# Altium footprint library DM6010_R0M0E0.PcbLib: 11 footprints
Each footprint in its own frame and in the unit in brackets; x right, y up, seen from the top. Pads: shape width x height; smd on the part's side, far side on the other; paste and mask are expansions set on the pad; w line width, h text height; cw(c..) or ccw(c..) is an arc to the next point about the centre after c.
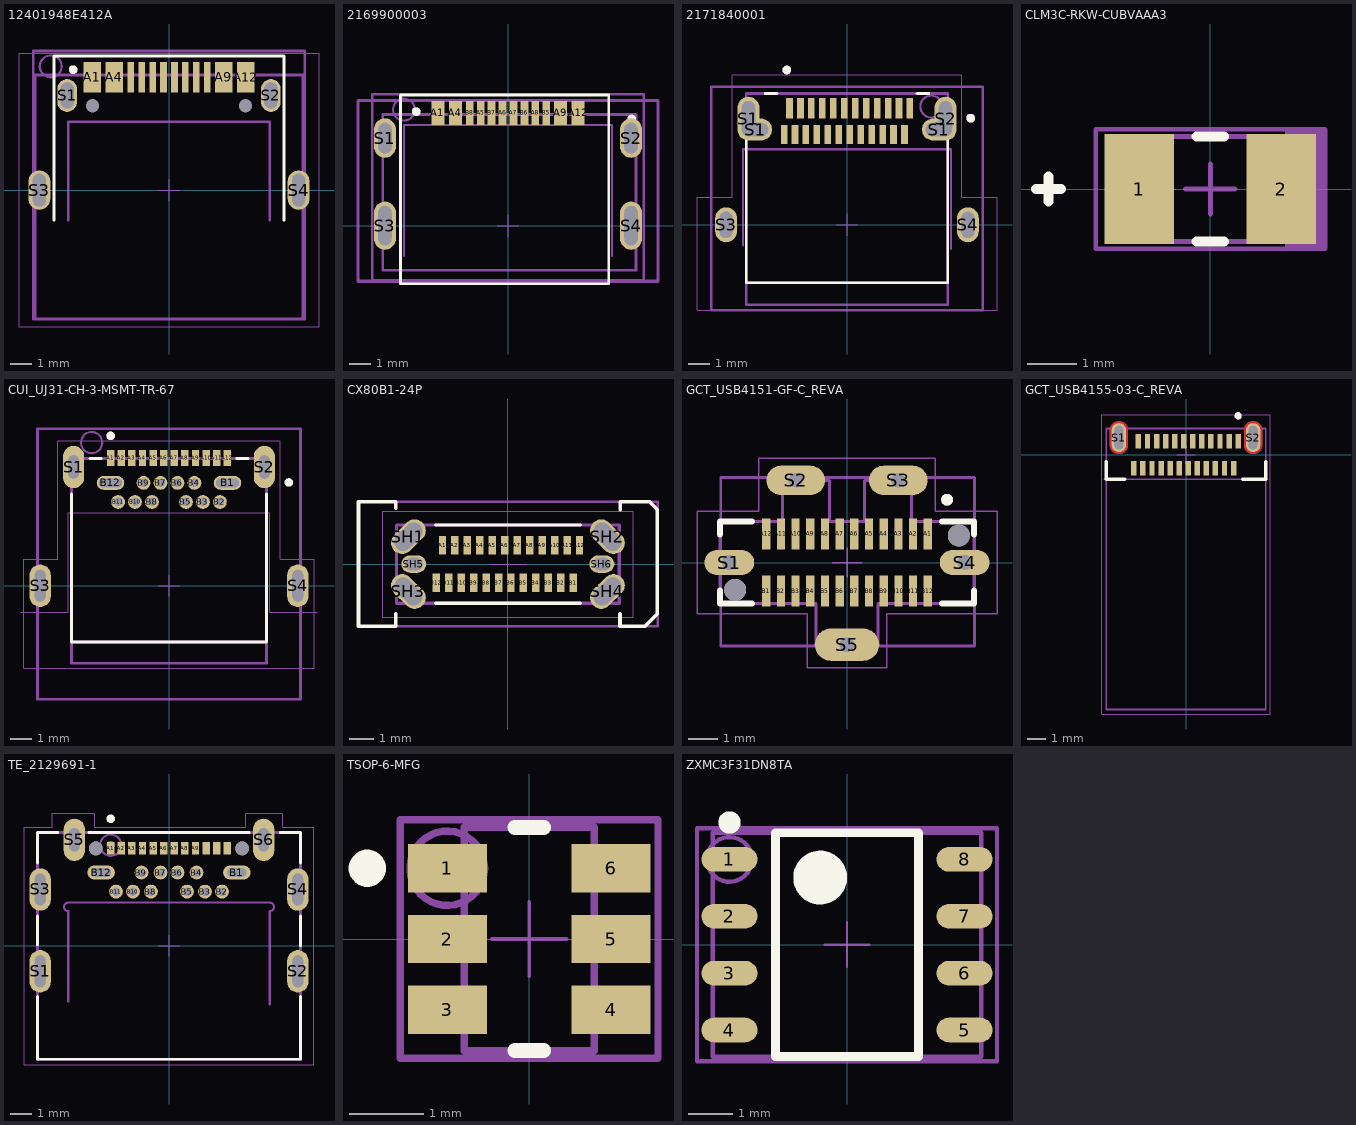
[diagram p0: the footprints below, top view; thin cyan lines are the x and y axes]

## 12401948E412A [mm]
pads (18):
  rect 0x0 hole 0.6 unplated paste-2 mask-2: A(-3.5,3.85) A(3.5,3.85)
  rect 0.8x1.4 smd: A1(-3.5,5.15) A4(-2.5,5.15) A9(2.5,5.15) A12(3.5,5.15)
  rect 0.3x1.4 smd: A5(-1.25,5.15) A6(-0.25,5.15) A7(0.25,5.15) A8(1.25,5.15) B5(1.75,5.15) B6(0.75,5.15) B7(-0.75,5.15) B8(-1.75,5.15)
  oval 0.9x1.5 hole 0.6 slot 1.2 at 90 deg: S1(-4.65,4.32) S2(4.65,4.32)
  oval 1x1.8 hole 0.6 slot 1.5 at 90 deg mask+0.102: S3(-5.92,0) S4(5.92,0)
Top Overlay:
  circle w0.2: c-4.375,5.5 r0.1
  lines w0.127: -5.25,-1.375 -5.25,6.125 5.25,6.125 5.25,-1.375
Mechanical 1:
  lines w0.1: -4.6,-1.375 -4.6,3.125 4.6,3.125 4.6,-1.375
Top Assembly:
  circle w0.1: c-5.4,5.65 r0.5
  lines w0.127: -6.2,-5.9 -6.2,6.35 6.2,6.35 6.2,-5.9 -6.2,-5.9
  text "'.Designator'" at 0,-0.125 h1
Top Courtyard:
  lines w0.05: -0.5,0 0.5,0 ; 0,-0.5 0,0.5 ; -6.85,-6.25 6.85,-6.25 6.85,1.25 6.85,6.25 -6.85,6.25 -6.85,1.25 -6.85,-6.25
Top Component Outline:
  lines w0.127: -6.125,-5.875 6.125,-5.875 6.125,5.25 -6.125,5.25 -6.125,-5.875
3D body "C12401948-1.stp": height 2.55, standoff -1.51, extent -6.065,-5.857 6.075,5.213

## 2169900003 [mm]
pads (16):
  rect 0.6x1.1 smd: A1(-3.2,5.15) A4(-2.4,5.15) A9(2.4,5.15) A12(3.2,5.15)
  rect 0.35x1.1 smd: A5(-1.25,5.15) A6(-0.25,5.15) A7(0.25,5.15) A8(1.25,5.15) B5(1.75,5.15) B6(0.75,5.15) B7(-0.75,5.15) B8(-1.75,5.15)
  oval 1x1.8 hole 0.6 slot 1.4 at 90 deg: S1(-5.62,4) S2(5.62,4)
  oval 1x2.2 hole 0.6 slot 1.8 at 90 deg mask+0.102: S3(-5.62,0) S4(5.62,0)
Top Overlay:
  circle w0.2: c-4.191,5.207 r0.1
  circle w0.2: c5.65,4.87 r0.1
  lines w0.127: -4.915,-2.65 -4.915,5.969 4.6,5.969 4.6,-2.65 -4.915,-2.65
Mechanical 1:
  lines w0.1: -4.75,-1.375 -4.75,4.6 4.75,4.6 4.75,-1.375
Top Assembly:
  circle w0.1: c-4.75,5.3 r0.5
  lines w0.127: -6.2,-2.5 -6.2,6 6.2,6 6.2,-2.5 -6.2,-2.5
  text "'.Designator'" at 0,-0.125 h1
Top 3D Body:
  circle w0.2: c-4.191,5.207 r0.1
Top Courtyard:
  lines w0.05: -0.5,0 0.5,0 ; 0,-0.5 0,0.5
  lines w0.15: -6.85,-2.54 -6.85,1.25 -6.85,5.715 6.85,5.715 6.85,1.25 6.85,-2.54 -6.85,-2.54
Top Component Outline:
  lines w0.127: -5.715,-2.032 -5.715,5.08 5.842,5.08 5.842,-2.032 -5.715,-2.032
3D body "2169900003.stp": height 2.16, standoff -1.02, extent -5.77,-2.076 5.77,5.124

## 2171840001 [mm]
pads (30):
  rect 0.3x0.95 smd: A1(-2.625,5.325) A2(-2.125,5.325) A3(-1.625,5.325) A4(-1.125,5.325) A5(-0.625,5.325) A6(-0.125,5.325) A7(0.375,5.325) A8(0.875,5.325) A9(1.375,5.325) A10(1.875,5.325) A11(2.375,5.325) A12(2.875,5.325)
  rect 0.3x0.85 smd: B1(2.625,4.125) B2(2.125,4.125) B3(1.625,4.125) B4(1.125,4.125) B5(0.625,4.125) B6(0.125,4.125) B7(-0.375,4.125) B8(-0.875,4.125) B9(-1.375,4.125) B10(-1.875,4.125) B11(-2.375,4.125) B12(-2.875,4.125)
  oval 1x2 hole 0.6 slot 1.6 at 90 deg: S1(-4.5,4.85) S2(4.5,4.85)
  oval 1.54x1 hole 0.6 slot 1.2 at 0 deg: S1(-4.191,4.35) S1(4.191,4.35)
  oval 1x1.6 hole 0.6 slot 1.2 at 90 deg: S3(-5.52,0) S4(5.52,0)
Top Overlay:
  circle w0.2: c-2.75,7.07 r0.1
  circle w0.2: c5.65,4.87 r0.1
  lines w0.127: -4.6,4.33 -4.6,-2.65 4.6,-2.65 4.6,4.33 ; -3.73,6 -3.2,6 ; 3.2,6 3.73,6
Mechanical 1:
  lines w0.1: -4.75,-0.95 -4.75,3.45 4.75,3.45 4.75,-1.1
Top Assembly:
  circle w0.1: c3.85,5.4 r0.5
  lines w0.127: -6.2,-3.9 6.2,-3.9 6.2,6.3 -6.2,6.3 -6.2,-3.9
  text "'.Designator'" at 0,-0.125 h1
Top 3D Body:
  circle w0.2: c-2.75,7.07 r0.1
  circle w0.2: c5.65,4.87 r0.1
  lines w0.127: -4.6,-2.65 -4.6,-3.65 4.6,-3.65 4.6,-2.65 ; -4.6,-2.65 -4.6,6 4.6,6 4.6,-2.65 ; -4.6,-2.65 4.6,-2.65
Top Courtyard:
  lines w0.05: -0.5,0 0.5,0 ; 0,-0.5 0,0.5 ; -6.85,-3.9 -6.85,1.25 -5.25,1.25 -5.25,6.85 5.25,6.85 5.25,1.25 6.85,1.25 6.85,-3.9 -6.85,-3.9
3D body "2171840001.stp": height 2.36, standoff -0.8, extent -5.67,-2.54 5.67,5.56

## CLM3C-RKW-CUBVAAA3 [mm]
pads (2):
  rect 1.4x2.2 smd paste+0 mask+0: 1(-1.425,0) 2(1.425,0)
Top Overlay:
  lines w0.2: -3.5,0 -3,0 ; -3.25,-0.25 -3.25,0.25 ; -0.275,-1.05 0.275,-1.05 ; -0.275,1.05 0.275,1.05
Top Assembly:
  rectangle: 1.5,-1.2 2.3,1.2
  lines w0.1: -2.3,-1.2 -2.3,1.2 2.3,1.2 2.3,-1.2 -2.3,-1.2
  text ".Designator" at 0,0 h1
Top Courtyard:
  lines w0.05: -2.3,-1.2 -2.3,1.2 2.3,1.2 2.3,-1.2 -2.3,-1.2
  lines w0.1: -0.5,0 0.5,0 ; 0,-0.5 0,0.5
Top Component Outline:
  lines w0.1: -1.4,-1.05 -1.4,1.05 1.4,1.05 1.4,-1.05 -1.4,-1.05
3D body "Diode_Cree_CLM3C-AKW-CUBVA353_eec.STEP": height 0.25, standoff 0, extent -2.3,-1.2 2.3,1.2

## CUI_UJ31-CH-3-MSMT-TR-67 [mm]
pads (28):
  rect 0.35x0.75 smd: A1(-2.75,6.025) A2(-2.25,6.025) A3(-1.75,6.025) A4(-1.25,6.025) A5(-0.75,6.025) A6(-0.25,6.025) A7(0.25,6.025) A8(0.75,6.025) A9(1.25,6.025) A10(1.75,6.025) A11(2.25,6.025) A12(2.75,6.025)
  oval 1.3x0.65 hole 0.4 slot 1.08 at 0 deg: B1(2.76,4.85) B12(-2.76,4.85)
  round 0.65 hole 0.4: B2(2.4,3.95) B3(1.6,3.95) B4(1.2,4.85) B5(0.8,3.95) B6(0.4,4.85) B7(-0.4,4.85) B8(-0.8,3.95) B9(-1.2,4.85) B10(-1.6,3.95) B11(-2.4,3.95)
  oval 1x2 hole 0.5 slot 1.1 at 90 deg: S1(-4.5,5.6) S2(4.5,5.6)
  oval 1x2 hole 0.5 slot 1.5 at 90 deg: S3(-6.075,0) S4(6.075,0)
Top Overlay:
  circle w0.2: c-2.75,7.07 r0.1
  circle w0.2: c5.65,4.87 r0.1
  lines w0.127: -4.6,4.33 -4.6,-2.65 4.6,-2.65 4.6,4.33 ; -3.73,6 -3.2,6 ; 3.2,6 3.73,6
Mechanical 1:
  lines w0: -7,-1.25 -4.75,-1.25 -4.75,3.45 4.75,3.45 4.75,-1.25 7,-1.25
Top Assembly:
  circle w0.1: c-3.65,6.75 r0.5
  lines w0.127: -6.2,-5.35 -6.2,7.4 6.2,7.4 6.2,-5.35 -6.2,-5.35
  text "'.Designator'" at 0,-0.125 h1
Top 3D Body:
  circle w0.2: c-2.75,7.07 r0.1
  lines w0.127: -4.6,-2.65 -4.6,-3.65 4.6,-3.65 4.6,-2.65 ; -4.6,-2.65 -4.6,6 4.6,6 4.6,-2.65 ; -4.6,-2.65 4.6,-2.65
Top Courtyard:
  lines w0.05: -0.5,0 0.5,0 ; 0,-0.5 0,0.5 ; -6.85,-3.9 -6.85,1.25 -5.25,1.25 -5.25,6.85 5.25,6.85 5.25,1.25 6.85,1.25 6.85,-3.9 -6.85,-3.9
3D body "CUI_DEVICES_UJ31-CH-3-MSMT-TR-67.step": height 2.32, standoff -1.7, extent -6.175,-3.713 6.175,6.223

## CX80B1-24P [mm] "USB3.1 Type-C Molex SMT, Through Hole, Vertical"
height 5
pads (30):
  rect 0.3x0.75 smd: A1(-2.625,0.755) A2(-2.125,0.755) A3(-1.625,0.755) A4(-1.125,0.755) A5(-0.625,0.755) A6(-0.125,0.755) A7(0.375,0.755) A8(0.875,0.755) A9(1.375,0.755) A10(1.875,0.755) A11(2.375,0.755) A12(2.875,0.755) B1(2.625,-0.755) B2(2.125,-0.755) B3(1.625,-0.755) B4(1.125,-0.755) B5(0.625,-0.755) B6(0.125,-0.755) B7(-0.375,-0.755) B8(-0.875,-0.755) B9(-1.375,-0.755) B10(-1.875,-0.755) B11(-2.375,-0.755) B12(-2.875,-0.755)
  oval 1.6x0.9 hole 0.7 slot 1.3 at 45 deg rot 45: SH1(-3.995,1.1) SH4(3.995,-1.1)
  oval 1.6x0.9 hole 0.7 slot 1.3 at 135 deg rot 135: SH2(3.995,1.1) SH3(-3.995,-1.1)
  oval 1x0.7 hole 0.5 slot 0.7 at 0 deg: SH5(-3.775,0) SH6(3.775,0)
Top Overlay:
  lines w0.127: -2.905,-1.57 2.905,-1.57 ; -2.905,1.57 2.905,1.57
  lines w0.15: -4.5,-1.993 -4.5,-2.5 -6,-2.5 -6,2.5 -4.5,2.5 -4.5,2.238 ; 4.502,-1.991 4.502,-2.5 5.506,-2.5 5.591,-2.415 6,-2.006 6,2.186 5.686,2.5 5.601,2.5 4.506,2.5 4.506,2.18
Top Solder:
  drawing of 2 lines, arcs and shapes, not listed
Bottom Solder:
  drawing of 2 lines, arcs and shapes, not listed
Top Assembly:
  lines w0.1: -5.999,-2.506 -5.999,2.501 6.024,2.501 6.024,-2.506 -5.999,-2.506
  text "'.Designator'" at -0.776,-0.315 h1
Top 3D Body:
  lines w0.127: -4.47,-1.57 -4.47,1.57 4.47,1.57 4.47,-1.57 -4.47,-1.57
Top Courtyard:
  lines w0.05: -0.75,0 0,0 ; 0,-0.75 0,0 ; 0,0.75 0,0 ; 0.75,0 0,0 ; -6.018,-2.488 6.012,-2.488 6.012,2.512 -6.018,2.512 -6.018,-2.488 ; -5.025,-2.125 -5.025,2.125 5.025,2.125 5.025,-2.125 -5.025,-2.125
Top Component Outline:
  lines w0.1: -6.01,-2.492 -6.01,2.504 6.027,2.504 6.027,-2.492 -6.01,-2.492
3D body "DXhfs.step": height 7.17, standoff -0.93, extent -4.745,-2.49 4.795,2.51

## GCT_USB4151-GF-C_REVA [mm]
pads (31):
  rect 0.28x1.05 smd: A1(2.75,0.975) A2(2.25,0.975) A3(1.75,0.975) A4(1.25,0.975) A5(0.75,0.975) A6(0.25,0.975) A7(-0.25,0.975) A8(-0.75,0.975) A9(-1.25,0.975) A10(-1.75,0.975) A11(-2.25,0.975) A12(-2.75,0.975) B1(-2.75,-0.975) B2(-2.25,-0.975) B3(-1.75,-0.975) B4(-1.25,-0.975) B5(-0.75,-0.975) B6(-0.25,-0.975) B7(0.25,-0.975) B8(0.75,-0.975) B9(1.25,-0.975) B10(1.75,-0.975) B11(2.25,-0.975) B12(2.75,-0.975)
  oval 1.7x0.85 hole 0.5 square: S1(-4.01,0) S4(4.01,0)
  oval 2x1 hole 0.5 square: S2(-1.75,2.8) S3(1.75,2.8)
  oval 2.2x1.1 hole 0.5 square: S5(0,-2.8)
  round 0.75 hole 0.75 unplated: ""(-3.81,-0.93) ""(3.81,0.92)
Top Overlay:
  circle w0.2: c3.41,2.14 r0.1
  lines w0.2: -4.33,-0.95 -4.33,-1.4 -3.24,-1.4 ; -4.33,0.95 -4.33,1.4 -3.24,1.4 ; 3.24,-1.4 4.33,-1.4 4.33,-0.95 ; 3.24,1.4 4.33,1.4 4.33,0.95
Top Assembly:
  lines w0.1: -4.3,-2.85 4.35,-2.85 4.35,2.9 -4.3,2.9 -4.3,-2.85
  text "'.Designator'" at 0,-0.125 h1
Top 3D Body:
  circle w0.2: c3.41,2.14 r0.1
Top Courtyard:
  lines w0.05: -0.5,0 0.5,0 ; 0,-0.5 0,0.5 ; -5.11,-1.75 -5.11,1.75 -3,1.75 -3,3.55 3,3.55 3,1.75 5.11,1.75 5.11,-1.75 1.35,-1.75 1.35,-3.58 -1.35,-3.58 -1.35,-1.75 -5.11,-1.75
Top Component Outline:
  lines w0.1: -4.33,-1.4 -4.33,1.4 -2.2,1.4 -2.2,2.8 -0.6,2.8 -0.6,1.4 0.6,1.4 0.6,2.8 2.2,2.8 2.2,1.4 4.33,1.4 4.33,-1.4 1.05,-1.4 1.05,-2.8 -1.05,-2.8 -1.05,-1.4 -4.33,-1.4
3D body "USB4151-GF-C--3DModel-STEP-56544.STEP": height 11.1, standoff -1.25, extent -4.33,-2.875 4.33,2.875

## GCT_USB4155-03-C_REVA [mm]
pads (26):
  rect 0.3x0.8 smd: A1(2.875,0.75) A2(2.375,0.75) A3(1.875,0.75) A4(1.375,0.75) A5(0.875,0.75) A6(0.375,0.75) A7(-0.125,0.75) A8(-0.625,0.75) A9(-1.125,0.75) A10(-1.625,0.75) A11(-2.125,0.75) A12(-2.625,0.75) B1(-2.875,-0.75) B2(-2.375,-0.75) B3(-1.875,-0.75) B4(-1.375,-0.75) B5(-0.875,-0.75) B6(-0.375,-0.75) B7(0.125,-0.75) B8(0.625,-0.75) B9(1.125,-0.75) B10(1.625,-0.75) B11(2.125,-0.75) B12(2.625,-0.75)
  oval 0.8x1.6 hole 0.5 slot 1.3 at 90 deg mask+0: S1(-3.7,0.95) S2(3.7,0.95)
Top Layer:
  region: 3.726,1.849 3.752,1.847 3.778,1.844 3.804,1.839 3.829,1.833 3.855,1.826 3.879,1.817 3.903,1.807 3.927,1.796 3.95,1.783 3.972,1.769 3.994,1.755 4.015,1.739 4.035,1.722 4.054,1.704 4.072,1.685 4.089,1.665 4.105,1.644 4.119,1.622 4.133,1.6 4.146,1.577 4.157,1.553 4.167,1.529 4.176,1.505 4.183,1.479 4.189,1.454 4.194,1.428 4.197,1.402 4.199,1.376 4.2,1.35 4.2,0.55 4.199,0.524 4.197,0.498 4.194,0.472 4.189,0.446 4.183,0.421 4.176,0.395 4.167,0.371 4.157,0.347 4.146,0.323 4.133,0.3 4.119,0.278 4.105,0.256 4.089,0.235 4.072,0.215 4.054,0.196 4.035,0.178 4.015,0.161 3.994,0.145 3.972,0.131 3.95,0.117 3.927,0.104 3.903,0.093 3.879,0.083 3.855,0.074 3.829,0.067 3.804,0.061 3.778,0.056 3.752,0.053 3.726,0.051 3.7,0.05 3.674,0.051 3.648,0.053 3.622,0.056 3.596,0.061 3.571,0.067 3.545,0.074 3.521,0.083 3.497,0.093 3.473,0.104 3.45,0.117 3.428,0.131 3.406,0.145 3.385,0.161 3.365,0.178 3.346,0.196 3.328,0.215 3.311,0.235 3.295,0.256 3.281,0.278 3.267,0.3 3.254,0.323 3.243,0.347 3.233,0.371 3.224,0.395 3.217,0.421 3.211,0.446 3.206,0.472 3.203,0.498 3.201,0.524 3.2,0.55 3.2,1.35 3.201,1.376 3.203,1.402 3.206,1.428 3.211,1.454 3.217,1.479 3.224,1.505 3.233,1.529 3.243,1.553 3.254,1.577 3.267,1.6 3.281,1.622 3.295,1.644 3.311,1.665 3.328,1.685 3.346,1.704 3.365,1.722 3.385,1.739 3.406,1.755 3.428,1.769 3.45,1.783 3.473,1.796 3.497,1.807 3.521,1.817 3.545,1.826 3.571,1.833 3.596,1.839 3.622,1.844 3.648,1.847 3.674,1.849 3.7,1.85
  region: -3.674,1.849 -3.648,1.847 -3.622,1.844 -3.596,1.839 -3.571,1.833 -3.545,1.826 -3.521,1.817 -3.497,1.807 -3.473,1.796 -3.45,1.783 -3.428,1.769 -3.406,1.755 -3.385,1.739 -3.365,1.722 -3.346,1.704 -3.328,1.685 -3.311,1.665 -3.295,1.644 -3.281,1.622 -3.267,1.6 -3.254,1.577 -3.243,1.553 -3.233,1.529 -3.224,1.505 -3.217,1.479 -3.211,1.454 -3.206,1.428 -3.203,1.402 -3.201,1.376 -3.2,1.35 -3.2,0.55 -3.201,0.524 -3.203,0.498 -3.206,0.472 -3.211,0.446 -3.217,0.421 -3.224,0.395 -3.233,0.371 -3.243,0.347 -3.254,0.323 -3.267,0.3 -3.281,0.278 -3.295,0.256 -3.311,0.235 -3.328,0.215 -3.346,0.196 -3.365,0.178 -3.385,0.161 -3.406,0.145 -3.428,0.131 -3.45,0.117 -3.473,0.104 -3.497,0.093 -3.521,0.083 -3.545,0.074 -3.571,0.067 -3.596,0.061 -3.622,0.056 -3.648,0.053 -3.674,0.051 -3.7,0.05 -3.726,0.051 -3.752,0.053 -3.778,0.056 -3.804,0.061 -3.829,0.067 -3.855,0.074 -3.879,0.083 -3.903,0.093 -3.927,0.104 -3.95,0.117 -3.972,0.131 -3.994,0.145 -4.015,0.161 -4.035,0.178 -4.054,0.196 -4.072,0.215 -4.089,0.235 -4.105,0.256 -4.119,0.278 -4.133,0.3 -4.146,0.323 -4.157,0.347 -4.167,0.371 -4.176,0.395 -4.183,0.421 -4.189,0.446 -4.194,0.472 -4.197,0.498 -4.199,0.524 -4.2,0.55 -4.2,1.35 -4.199,1.376 -4.197,1.402 -4.194,1.428 -4.189,1.454 -4.183,1.479 -4.176,1.505 -4.167,1.529 -4.157,1.553 -4.146,1.577 -4.133,1.6 -4.119,1.622 -4.105,1.644 -4.089,1.665 -4.072,1.685 -4.054,1.704 -4.035,1.722 -4.015,1.739 -3.994,1.755 -3.972,1.769 -3.95,1.783 -3.927,1.796 -3.903,1.807 -3.879,1.817 -3.855,1.826 -3.829,1.833 -3.804,1.839 -3.778,1.844 -3.752,1.847 -3.726,1.849 -3.7,1.85
Bottom Layer:
  region: 3.726,1.849 3.752,1.847 3.778,1.844 3.804,1.839 3.829,1.833 3.855,1.826 3.879,1.817 3.903,1.807 3.927,1.796 3.95,1.783 3.972,1.769 3.994,1.755 4.015,1.739 4.035,1.722 4.054,1.704 4.072,1.685 4.089,1.665 4.105,1.644 4.119,1.622 4.133,1.6 4.146,1.577 4.157,1.553 4.167,1.529 4.176,1.505 4.183,1.479 4.189,1.454 4.194,1.428 4.197,1.402 4.199,1.376 4.2,1.35 4.2,0.55 4.199,0.524 4.197,0.498 4.194,0.472 4.189,0.446 4.183,0.421 4.176,0.395 4.167,0.371 4.157,0.347 4.146,0.323 4.133,0.3 4.119,0.278 4.105,0.256 4.089,0.235 4.072,0.215 4.054,0.196 4.035,0.178 4.015,0.161 3.994,0.145 3.972,0.131 3.95,0.117 3.927,0.104 3.903,0.093 3.879,0.083 3.855,0.074 3.829,0.067 3.804,0.061 3.778,0.056 3.752,0.053 3.726,0.051 3.7,0.05 3.674,0.051 3.648,0.053 3.622,0.056 3.596,0.061 3.571,0.067 3.545,0.074 3.521,0.083 3.497,0.093 3.473,0.104 3.45,0.117 3.428,0.131 3.406,0.145 3.385,0.161 3.365,0.178 3.346,0.196 3.328,0.215 3.311,0.235 3.295,0.256 3.281,0.278 3.267,0.3 3.254,0.323 3.243,0.347 3.233,0.371 3.224,0.395 3.217,0.421 3.211,0.446 3.206,0.472 3.203,0.498 3.201,0.524 3.2,0.55 3.2,1.35 3.201,1.376 3.203,1.402 3.206,1.428 3.211,1.454 3.217,1.479 3.224,1.505 3.233,1.529 3.243,1.553 3.254,1.577 3.267,1.6 3.281,1.622 3.295,1.644 3.311,1.665 3.328,1.685 3.346,1.704 3.365,1.722 3.385,1.739 3.406,1.755 3.428,1.769 3.45,1.783 3.473,1.796 3.497,1.807 3.521,1.817 3.545,1.826 3.571,1.833 3.596,1.839 3.622,1.844 3.648,1.847 3.674,1.849 3.7,1.85
  region: -3.674,1.849 -3.648,1.847 -3.622,1.844 -3.596,1.839 -3.571,1.833 -3.545,1.826 -3.521,1.817 -3.497,1.807 -3.473,1.796 -3.45,1.783 -3.428,1.769 -3.406,1.755 -3.385,1.739 -3.365,1.722 -3.346,1.704 -3.328,1.685 -3.311,1.665 -3.295,1.644 -3.281,1.622 -3.267,1.6 -3.254,1.577 -3.243,1.553 -3.233,1.529 -3.224,1.505 -3.217,1.479 -3.211,1.454 -3.206,1.428 -3.203,1.402 -3.201,1.376 -3.2,1.35 -3.2,0.55 -3.201,0.524 -3.203,0.498 -3.206,0.472 -3.211,0.446 -3.217,0.421 -3.224,0.395 -3.233,0.371 -3.243,0.347 -3.254,0.323 -3.267,0.3 -3.281,0.278 -3.295,0.256 -3.311,0.235 -3.328,0.215 -3.346,0.196 -3.365,0.178 -3.385,0.161 -3.406,0.145 -3.428,0.131 -3.45,0.117 -3.473,0.104 -3.497,0.093 -3.521,0.083 -3.545,0.074 -3.571,0.067 -3.596,0.061 -3.622,0.056 -3.648,0.053 -3.674,0.051 -3.7,0.05 -3.726,0.051 -3.752,0.053 -3.778,0.056 -3.804,0.061 -3.829,0.067 -3.855,0.074 -3.879,0.083 -3.903,0.093 -3.927,0.104 -3.95,0.117 -3.972,0.131 -3.994,0.145 -4.015,0.161 -4.035,0.178 -4.054,0.196 -4.072,0.215 -4.089,0.235 -4.105,0.256 -4.119,0.278 -4.133,0.3 -4.146,0.323 -4.157,0.347 -4.167,0.371 -4.176,0.395 -4.183,0.421 -4.189,0.446 -4.194,0.472 -4.197,0.498 -4.199,0.524 -4.2,0.55 -4.2,1.35 -4.199,1.376 -4.197,1.402 -4.194,1.428 -4.189,1.454 -4.183,1.479 -4.176,1.505 -4.167,1.529 -4.157,1.553 -4.146,1.577 -4.133,1.6 -4.119,1.622 -4.105,1.644 -4.089,1.665 -4.072,1.685 -4.054,1.704 -4.035,1.722 -4.015,1.739 -3.994,1.755 -3.972,1.769 -3.95,1.783 -3.927,1.796 -3.903,1.807 -3.879,1.817 -3.855,1.826 -3.829,1.833 -3.804,1.839 -3.778,1.844 -3.752,1.847 -3.726,1.849 -3.7,1.85
Top Overlay:
  circle w0.2: c2.875,2.15 r0.1
  lines w0.2: -4.4,-0.4 -4.4,-1.35 -3.375,-1.35 ; 3.125,-1.35 4.4,-1.35 4.4,-0.4
Top Solder:
  drawing of 2 lines, arcs and shapes, not listed
Bottom Solder:
  drawing of 2 lines, arcs and shapes, not listed
Mechanical 1:
  lines w0.1: -4.1,-1.35 -4.5,-1.35 4.45,-1.35
Top Assembly:
  circle w0.2: c2.875,2.15 r0.1
  lines w0.1: -4.4,-14.05 4.4,-14.05 4.4,1.45 -4.4,1.45 -4.4,-14.05
  text "'.Designator'" at 0,-0.125 h1
Top Courtyard:
  lines w0.05: -0.5,0 0.5,0 ; 0,-0.5 0,0.5 ; -4.65,-14.3 4.65,-14.3 4.65,2.2 -4.65,2.2 -4.65,-14.3
Top Component Outline:
  lines w0.1: -4.4,-14.05 4.4,-14.05 4.4,1.45 -4.4,1.45 -4.4,-14.05
3D body "USB4155-03-C--3DModel-STEP-1.STEP": height 1.62, standoff -1.28, extent -4.4,-14.039 4.4,1.461

## TE_2129691-1 [mm]
pads (32):
  rect 0.35x0.6 smd: A1(-2.75,4.6) A2(-2.25,4.6) A3(-1.75,4.6) A4(-1.25,4.6) A5(-0.75,4.6) A6(-0.25,4.6) A7(0.25,4.6) A8(0.75,4.6) A9(1.25,4.6) A10(1.75,4.6) A11(2.25,4.6) A12(2.75,4.6)
  oval 1.3x0.65 hole 0.4 slot 0.9 at 0 deg: B1(3.2,3.46) B12(-3.2,3.46)
  round 0.65 hole 0.4: B2(2.5,2.56) B3(1.7,2.56) B4(1.3,3.46) B5(0.85,2.56) B6(0.4,3.46) B7(-0.4,3.46) B8(-0.85,2.56) B9(-1.3,3.46) B10(-1.7,2.56) B11(-2.5,2.56)
  oval 1x2 hole 0.5 slot 1.5 at 90 deg: S1(-6.075,-1.2) S2(6.075,-1.2) S3(-6.075,2.66) S4(6.075,2.66)
  oval 1x2 hole 0.5 slot 1.1 at 90 deg: S5(-4.465,5) S6(4.465,5)
  round 0.65 hole 0.65 unplated: ""(-3.45,4.6) ""(3.45,4.6)
Top Overlay:
  circle w0.2: c-2.75,6 r0.1
  lines w0.127: -6.2,-2.39 -6.2,-5.35 6.2,-5.35 6.2,-2.39 ; -6.2,0.06 -6.2,1.41 ; -6.2,3.91 -6.2,5.35 -5.25,5.35 ; -3.78,5.35 3.78,5.35 ; 5.25,5.35 6.2,5.35 6.2,3.91 ; 6.2,0.01 6.2,1.41
Mechanical 1:
  lines w0.1: -4.75,-2.625 -4.75,1.64 cw(c-4.75,1.84) -4.75,2.04 4.75,2.04 cw(c4.75,1.84) 4.75,1.64 4.75,-2.75
Top Assembly:
  circle w0.1: c-2.75,4.75 r0.5
  lines w0.127: -6.2,-5.35 -6.2,5.35 6.2,5.35 6.2,-5.35 -6.2,-5.35
  text "'.Designator'" at 0,-0.125 h1
Top Courtyard:
  lines w0.05: -0.5,0 0.5,0 ; 0,-0.5 0,0.5 ; -6.83,-5.6 -6.83,5.6 -5.5,5.6 -5.5,6.25 -3.5,6.25 -3.5,5.6 3.625,5.6 3.625,6.25 5.375,6.25 5.375,5.6 6.83,5.6 6.83,-5.6 -6.83,-5.6
Top Component Outline:
  circle w0.2: c-2.75,4.75 r0.1
  lines w0.127: -6.2,-5.35 -6.2,5.35 6.2,5.35 6.2,-5.35 -6.2,-5.35
3D body "2129691-1--3DModel-STEP-56544.STEP": height 2.25, standoff -1.08, extent -6.175,-5.35 6.175,5.35

## TSOP-6-MFG [mm]
pads (6):
  rect 1.06x0.65 smd: 1(-1.1,0.95) 2(-1.1,0) 3(-1.1,-0.95) 4(1.1,-0.95) 5(1.1,0) 6(1.1,0.95)
Top Overlay:
  circle w0.25: c-2.175,0.95 r0.125
  lines w0.2: -0.195,-1.5 0.195,-1.5 ; -0.195,1.5 0.195,1.5
Top Assembly:
  circle w0.1: c-1.1,0.95 r0.5
  lines w0.1: -1.73,-1.6 -1.73,1.6 1.73,1.6 1.73,-1.6 -1.73,-1.6
  text ".Designator" at 0,0.188 h1
Top Courtyard:
  lines w0.05: -0.5,0 0.5,0 ; 0,-0.5 0,0.5 ; -1.73,-1.6 -1.73,1.6 1.73,1.6 1.73,-1.6 -1.73,-1.6
Top Component Outline:
  lines w0.1: -0.875,-1.5 -0.875,1.5 0.875,1.5 0.875,-1.5 -0.875,-1.5
3D body "Trans_Infineon_IRLTS2242TRPBF_eec.STEP": height 0.25, standoff 0, extent -1.73,-1.6 1.73,1.6

## ZXMC3F31DN8TA [mm] "SOIC, 8-Leads, Body 5x4mm, Pitch 1.27mm, IPC High Density"
height 1.73
pads (8):
  oval 1.25x0.55 smd: 1(-2.625,1.905) 2(-2.625,0.635) 3(-2.625,-0.635) 4(-2.625,-1.905) 5(2.625,-1.905) 6(2.625,-0.635) 7(2.625,0.635) 8(2.625,1.905)
Top Overlay:
  circle w0.6: c-0.6,1.5 r0.3
  circle w0.25: c-2.625,2.73 r0.125
  lines w0.2: -1.6,-2.5 1.6,-2.5 1.6,2.5 -1.6,2.5 -1.6,-2.5
Top Assembly:
  circle w0.1: c-2.625,1.905 r0.5
  lines w0.1: -3.35,-2.6 3.35,-2.6 3.35,2.6 -3.35,2.6 -3.35,-2.6
  text "'.Designator'" at 0,0 h1
Top Courtyard:
  lines w0.05: -0.5,0 0.5,0 ; 0,-0.5 0,0.5 ; -3.35,-2.6 3.35,-2.6 3.35,2.6 -3.35,2.6 -3.35,-2.6
Top Component Outline:
  lines w0.1: -2.995,-2.5 2.995,-2.5 2.995,2.5 -2.995,2.5 -2.995,-2.5
3D body "SOIC127P600X173-8L.step": height 1.73, standoff 0, extent -2.995,-2.5 2.995,2.5